# Altium footprint library Miscellaneous THD.PcbLib: 216 footprints (part 15 of 15)
Each footprint in its own frame and in the unit in brackets; x right, y up, seen from the top. Pads: shape width x height; smd on the part's side, far side on the other; paste and mask are expansions set on the pad; w line width, h text height; cw(c..) or ccw(c..) is an arc to the next point about the centre after c.
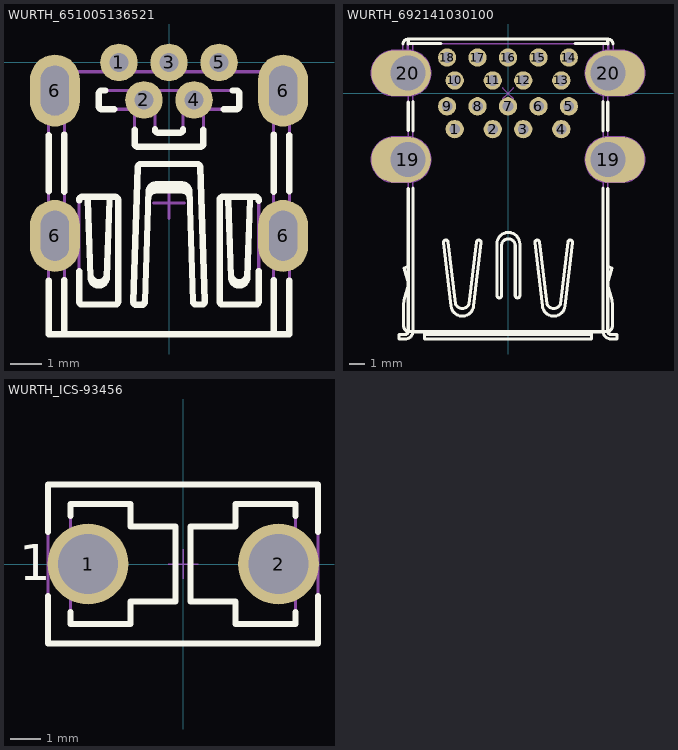
[diagram p14: the footprints below, top view; thin cyan lines are the x and y axes]

## WURTH_651005136521 [mm] "Mini USB Type B Horizontal 5 Contacts"
height 3.9
pads (9):
  round 1.2 hole 0.6: 1(-1.6,0) 2(-0.8,-1.2) 3(0,0) 4(0.8,-1.2) 5(1.6,0)
  oval 1.6x2.3 hole 0.9 slot 1.6 at 90 deg: 6(-3.65,-5.55) 6(-3.65,-0.9) 6(3.65,-5.55) 6(3.65,-0.9)
Top Overlay:
  lines w0.2: -3.85,-6.982 -3.85,-8.7 3.85,-8.7 3.85,-6.982 ; -3.85,-4.118 -3.85,-2.332 ; -3.35,-8.7 -3.35,-6.958 ; -3.35,-4.142 -3.35,-2.308 ; -2.875,-6.681 -2.875,-7.65 ccw(c-2.775,-7.65) -2.775,-7.75 -1.725,-7.75 ccw(c-1.725,-7.65) -1.625,-7.65 -1.625,-4.4 ccw(c-1.725,-4.4) -1.725,-4.3 -2.775,-4.3 ccw(c-2.775,-4.4) -2.875,-4.4 -2.875,-4.419 ; -2.694,-4.3 cw(c-2.694,-4.396) -2.597,-4.396 -2.509,-6.881 ccw(c-2.25,-6.881) -1.991,-6.881 -1.904,-4.396 ; -2.513,-6.771 ccw(c-2.25,-6.769) -1.987,-6.769 ; -2.036,-0.9 -2.15,-0.9 ccw(c-2.15,-1) -2.25,-1 -2.25,-1.4 ccw(c-2.15,-1.4) -2.15,-1.5 -1.754,-1.5 ; -1.904,-4.403 cw(c-1.801,-4.403) -1.801,-4.3 ; -1.1,-2.154 -1.1,-2.6 ccw(c-1,-2.6) -1,-2.7 1,-2.7 ccw(c1,-2.6) 1.1,-2.6 1.1,-2.154 ; -0.661,-4.328 cw(c-0.425,-4.336) -0.425,-4.1 0.425,-4.1 cw(c0.425,-4.336) 0.661,-4.328 ; -0.45,-2.137 -0.45,-2.15 ccw(c-0.35,-2.15) -0.35,-2.25 0.35,-2.25 ccw(c0.35,-2.15) 0.45,-2.15 0.45,-2.137 ; 1.754,-1.5 2.15,-1.5 ccw(c2.15,-1.4) 2.25,-1.4 2.25,-1 ccw(c2.15,-1) 2.15,-0.9 2.036,-0.9 ; 1.802,-4.3 cw(c1.802,-4.396) 1.898,-4.396 1.987,-6.881 ccw(c2.246,-6.881) 2.504,-6.881 2.592,-4.396 ; 1.983,-6.771 ccw(c2.246,-6.769) 2.508,-6.769 ; 2.591,-4.403 cw(c2.695,-4.403) 2.695,-4.3 ; 2.871,-6.676 2.871,-7.65 cw(c2.771,-7.65) 2.771,-7.75 1.721,-7.75 cw(c1.721,-7.65) 1.621,-7.65 1.621,-4.4 cw(c1.721,-4.4) 1.721,-4.3 2.771,-4.3 cw(c2.771,-4.4) 2.871,-4.4 2.871,-4.424 ; 3.35,-8.7 3.35,-6.958 ; 3.35,-4.142 3.35,-2.308 ; 3.85,-4.118 3.85,-2.332 ; -1.147,-7.653 ccw(c-1.047,-7.657) -1.047,-7.757 -0.872,-7.757 ccw(c-0.872,-7.657) -0.772,-7.66 -0.654,-4.129 cw(c-0.418,-4.137) -0.418,-3.901 0.418,-3.901 cw(c0.418,-4.137) 0.654,-4.129 0.772,-7.653 ccw(c0.872,-7.65) 0.872,-7.75 1.047,-7.75 ccw(c1.047,-7.65) 1.147,-7.647 0.999,-3.347 ccw(c0.9,-3.35) 0.9,-3.25 -0.9,-3.25 ccw(c-0.9,-3.35) -0.999,-3.347 -1.147,-7.653
Mechanical 8:
  lines w0.1: -3.9,-5.9 -3.65,-5.9 ; -3.9,-5.55 -3.65,-5.55 ; -3.9,-5.2 -3.65,-5.2 ; -3.9,-1.25 -3.65,-1.25 ; -3.9,-0.9 -3.65,-0.9 ; -3.9,-0.55 -3.65,-0.55 ; -3.65,-6.15 -3.65,-5.9 ; -3.65,-5.8 -3.65,-5.55 ; -3.65,-5.3 -3.65,-5.55 ; -3.65,-4.95 -3.65,-5.2 ; -3.65,-1.5 -3.65,-1.25 ; -3.65,-1.15 -3.65,-0.9 ; -3.65,-0.65 -3.65,-0.9 ; -3.65,-0.3 -3.65,-0.55 ; -3.4,-5.9 -3.65,-5.9 ; -3.4,-5.55 -3.65,-5.55 ; -3.4,-5.2 -3.65,-5.2 ; -3.4,-1.25 -3.65,-1.25 ; -3.4,-0.9 -3.65,-0.9 ; -3.4,-0.55 -3.65,-0.55 ; -2.1,0 -1.6,0 ; -1.6,-0.5 -1.6,0 ; -1.6,0.5 -1.6,0 ; -1.3,-1.2 -0.8,-1.2 ; -1.1,0 -1.6,0 ; -0.8,-1.7 -0.8,-1.2 ; -0.8,-0.7 -0.8,-1.2 ; -0.5,-4.5 0,-4.5 ; -0.5,0 0,0 ; -0.3,-1.2 -0.8,-1.2 ; 0,-5 0,-4.5 ; 0,-4 0,-4.5 ; 0,-0.5 0,0 ; 0,0.5 0,0 ; 0.3,-1.2 0.8,-1.2 ; 0.5,-4.5 0,-4.5 ; 0.5,0 0,0 ; 0.8,-1.7 0.8,-1.2 ; 0.8,-0.7 0.8,-1.2 ; 1.1,0 1.6,0 ; 1.3,-1.2 0.8,-1.2 ; 1.6,-0.5 1.6,0 ; 1.6,0.5 1.6,0 ; 2.1,0 1.6,0 ; 3.4,-5.9 3.65,-5.9 ; 3.4,-5.55 3.65,-5.55 ; 3.4,-5.2 3.65,-5.2 ; 3.4,-1.25 3.65,-1.25 ; 3.4,-0.9 3.65,-0.9 ; 3.4,-0.55 3.65,-0.55 ; 3.65,-6.15 3.65,-5.9 ; 3.65,-5.8 3.65,-5.55 ; 3.65,-5.3 3.65,-5.55 ; 3.65,-4.95 3.65,-5.2 ; 3.65,-1.5 3.65,-1.25 ; 3.65,-1.15 3.65,-0.9 ; 3.65,-0.65 3.65,-0.9 ; 3.65,-0.3 3.65,-0.55 ; 3.9,-5.9 3.65,-5.9 ; 3.9,-5.55 3.65,-5.55 ; 3.9,-5.2 3.65,-5.2 ; 3.9,-1.25 3.65,-1.25 ; 3.9,-0.9 3.65,-0.9 ; 3.9,-0.55 3.65,-0.55 ; -4.1,-5.9 ccw(c-3.65,-5.9) -3.2,-5.9 -3.2,-5.2 ccw(c-3.65,-5.2) -4.1,-5.2 -4.1,-5.9 ; -4.1,-1.25 ccw(c-3.65,-1.25) -3.2,-1.25 -3.2,-0.55 ccw(c-3.65,-0.55) -4.1,-0.55 -4.1,-1.25 ; 3.2,-5.9 ccw(c3.65,-5.9) 4.1,-5.9 4.1,-5.2 ccw(c3.65,-5.2) 3.2,-5.2 3.2,-5.9 ; 3.2,-1.25 ccw(c3.65,-1.25) 4.1,-1.25 4.1,-0.55 ccw(c3.65,-0.55) 3.2,-0.55 3.2,-1.25
Mechanical 14:
  lines w0.1: -3.85,-5.955 cw(c-3.675,-5.595) -4.075,-5.595 -4.075,-5.505 cw(c-3.675,-5.505) -3.85,-5.145 ; -3.85,-1.305 cw(c-3.675,-0.945) -4.075,-0.945 -4.075,-0.855 cw(c-3.675,-0.855) -3.85,-0.495 ; -3.35,-8.7 -3.35,-0.3 ; -2.694,-4.3 cw(c-2.694,-4.396) -2.597,-4.396 -2.509,-6.881 ccw(c-2.25,-6.881) -1.991,-6.881 -1.904,-4.396 ; -2.513,-6.771 ccw(c-2.25,-6.769) -1.987,-6.769 ; -1.904,-4.403 cw(c-1.801,-4.403) -1.801,-4.3 ; -1.8,-0.3 -1.8,0.125 -1.4,0.125 -1.4,-0.3 ; -0.661,-4.328 cw(c-0.425,-4.336) -0.425,-4.1 0.425,-4.1 cw(c0.425,-4.336) 0.661,-4.328 ; -0.55,-0.9 cw(c-0.55,-1) -0.45,-1 -0.45,-2.15 ccw(c-0.35,-2.15) -0.35,-2.25 0.35,-2.25 ccw(c0.35,-2.15) 0.45,-2.15 0.45,-1 cw(c0.55,-1) 0.55,-0.9 ; -0.2,-0.3 -0.2,0.125 0.2,0.125 0.2,-0.3 ; 1.4,-0.3 1.4,0.125 1.8,0.125 1.8,-0.3 ; 1.802,-4.3 cw(c1.802,-4.396) 1.898,-4.396 1.987,-6.881 ccw(c2.246,-6.881) 2.504,-6.881 2.592,-4.396 ; 1.983,-6.771 ccw(c2.246,-6.769) 2.508,-6.769 ; 2.591,-4.403 cw(c2.695,-4.403) 2.695,-4.3 ; 3.35,-8.7 3.35,-0.3 ; 3.85,-5.955 ccw(c3.675,-5.595) 4.075,-5.595 4.075,-5.505 ccw(c3.675,-5.505) 3.85,-5.145 ; 3.85,-1.305 ccw(c3.675,-0.945) 4.075,-0.945 4.075,-0.855 ccw(c3.675,-0.855) 3.85,-0.495 ; -3.85,-8.7 3.85,-8.7 3.85,-0.3 -3.85,-0.3 -3.85,-8.7 ; -2.875,-7.65 ccw(c-2.775,-7.65) -2.775,-7.75 -1.725,-7.75 ccw(c-1.725,-7.65) -1.625,-7.65 -1.625,-4.4 ccw(c-1.725,-4.4) -1.725,-4.3 -2.775,-4.3 ccw(c-2.775,-4.4) -2.875,-4.4 -2.875,-7.65 ; -2.25,-1.4 ccw(c-2.15,-1.4) -2.15,-1.5 -1.2,-1.5 cw(c-1.2,-1.6) -1.1,-1.6 -1.1,-2.6 ccw(c-1,-2.6) -1,-2.7 1,-2.7 ccw(c1,-2.6) 1.1,-2.6 1.1,-1.6 cw(c1.2,-1.6) 1.2,-1.5 2.15,-1.5 ccw(c2.15,-1.4) 2.25,-1.4 2.25,-1 ccw(c2.15,-1) 2.15,-0.9 -2.15,-0.9 ccw(c-2.15,-1) -2.25,-1 -2.25,-1.4 ; -1.147,-7.653 ccw(c-1.047,-7.657) -1.047,-7.757 -0.872,-7.757 ccw(c-0.872,-7.657) -0.772,-7.66 -0.654,-4.129 cw(c-0.418,-4.137) -0.418,-3.901 0.418,-3.901 cw(c0.418,-4.137) 0.654,-4.129 0.772,-7.653 ccw(c0.872,-7.65) 0.872,-7.75 1.047,-7.75 ccw(c1.047,-7.65) 1.147,-7.647 0.999,-3.347 ccw(c0.9,-3.35) 0.9,-3.25 -0.9,-3.25 ccw(c-0.9,-3.35) -0.999,-3.347 -1.147,-7.653 ; 1.621,-7.65 ccw(c1.721,-7.65) 1.721,-7.75 2.771,-7.75 ccw(c2.771,-7.65) 2.871,-7.65 2.871,-4.4 ccw(c2.771,-4.4) 2.771,-4.3 1.721,-4.3 ccw(c1.721,-4.4) 1.621,-4.4 1.621,-7.65
3D body "WURTH_651005136521.stp": height 3.9, standoff -2.6, extent -4.075,-8.7 4.075,0.125

## WURTH_692141030100 [mm] "USB 3.0 Type A Stacked Right Angle Receptacle"
height 16.11
pads (22):
  round 1.2 hole 0.7: 1(-3.5,-2.35) 2(-1,-2.35) 3(1,-2.35) 4(3.5,-2.35) 5(4,-0.85) 6(2,-0.85) 7(0,-0.85) 8(-2,-0.85) 9(-4,-0.85) 10(-3.5,0.85) 11(-1,0.85) 12(1,0.85) 13(3.5,0.85) 14(4,2.35) 15(2,2.35) 16(0,2.35) 17(-2,2.35) 18(-4,2.35)
  oval 3.9x3 hole 2.3 copper offset -0.45,0: 19(-6.57,-4.35) 20(-6.57,1.33)
  oval 3.9x3 hole 2.3 copper offset 0.45,0: 19(6.57,-4.35) 20(6.57,1.33)
Top Overlay:
  lines w0.2: -6.9,3.23 cw(c-6.55,3.22) -6.55,3.57 ; -6.553,-15.666 cw(c-6.45,-15.28) -6.85,-15.28 -6.85,-13.78 cw(c-6.05,-13.78) -6.823,-13.575 -6.55,-12.544 ; -6.55,-12.49 -6.839,-11.461 -6.55,-11.38 ; -6.55,-6.25 -6.55,-15.63 ; -6.55,-2.45 -6.55,-0.57 ; -6.55,3.23 -6.55,3.57 ; -6.55,3.27 -4.392,3.27 ; -6.253,-15.68 -5.475,-15.68 ; -6.25,-6.223 -6.25,-15.63 cw(c-6.75,-15.63) -6.75,-16.13 -7.15,-16.13 -7.15,-15.83 -6.75,-15.83 ccw(c-6.75,-15.63) -6.55,-15.63 ; -6.25,-2.477 -6.25,-0.543 ; -5.475,-15.83 5.475,-15.83 ; -5.475,-15.63 -5.475,-16.13 5.475,-16.13 5.475,-15.634 ; 4.392,3.27 6.55,3.27 ; 5.475,-15.68 6.253,-15.68 ; 6.25,-6.223 6.25,-15.63 ccw(c6.75,-15.63) 6.762,-16.13 7.15,-16.13 7.15,-15.83 6.75,-15.83 cw(c6.75,-15.63) 6.55,-15.63 ; 6.25,-2.477 6.25,-0.543 ; 6.55,-12.544 6.823,-13.575 cw(c6.05,-13.78) 6.85,-13.78 6.85,-15.28 cw(c6.45,-15.28) 6.553,-15.666 ; 6.55,-12.49 6.839,-11.461 6.55,-11.381 ; 6.55,-6.25 6.55,-15.63 ; 6.55,-2.45 6.55,-0.57 ; 6.55,3.23 6.55,3.57 ; 6.9,3.23 ccw(c6.55,3.22) 6.55,3.57 ; -6.55,-15.63 6.55,-15.63 ; -6.55,3.57 6.55,3.57 ; -4.231,-9.797 cw(c-4.083,-9.779) -3.935,-9.763 -3.449,-13.83 ccw(c-3,-13.636) -2.551,-13.83 -2.065,-9.763 cw(c-1.917,-9.779) -1.769,-9.797 -2.255,-13.967 cw(c-3,-13.88) -3.745,-13.967 -4.231,-9.797 ; -0.725,-13.28 ccw(c-0.575,-13.28) -0.425,-13.28 -0.425,-9.947 cw(c0.025,-10.008) 0.475,-9.947 0.475,-13.28 ccw(c0.625,-13.28) 0.775,-13.28 0.775,-9.88 ccw(c0.025,-9.88) -0.725,-9.88 -0.725,-13.28 ; 1.769,-9.797 cw(c1.917,-9.779) 2.065,-9.763 2.551,-13.83 ccw(c3,-13.636) 3.449,-13.83 3.935,-9.763 cw(c4.083,-9.779) 4.231,-9.797 3.745,-13.967 cw(c3,-13.88) 2.255,-13.967 1.769,-9.797
Mechanical 8:
  circle w0.1: c6.57,1.33 r1.15
  circle w0.1: c6.57,-4.35 r1.15
  circle w0.1: c-6.57,-4.35 r1.15
  circle w0.1: c-6.57,1.33 r1.15
  lines w0.1: -7.52,-4.35 -7.02,-4.35 ; -7.52,1.33 -7.02,1.33 ; -7.07,1.33 -6.57,1.33 ; -7.02,-4.85 -7.02,-4.35 ; -7.02,-3.85 -7.02,-4.35 ; -7.02,0.83 -7.02,1.33 ; -7.02,1.83 -7.02,1.33 ; -6.57,-4.85 -6.57,-4.35 ; -6.57,-3.85 -6.57,-4.35 ; -6.57,0.83 -6.57,1.33 ; -6.57,1.83 -6.57,1.33 ; -6.07,-4.35 -6.57,-4.35 ; -6.07,1.33 -6.57,1.33 ; -4.5,-0.85 -4,-0.85 ; -4.5,2.35 -4,2.35 ; -4,-1.35 -4,-0.85 ; -4,-0.35 -4,-0.85 ; -4,1.85 -4,2.35 ; -4,2.85 -4,2.35 ; -3.5,-2.85 -3.5,-2.35 ; -3.5,-1.85 -3.5,-2.35 ; -3.5,-0.85 -4,-0.85 ; -3.5,0.35 -3.5,0.85 ; -3.5,1.35 -3.5,0.85 ; -3.5,2.35 -4,2.35 ; -3,-2.35 -3.5,-2.35 ; -3,0.85 -3.5,0.85 ; -2.5,-0.85 -2,-0.85 ; -2.5,2.35 -2,2.35 ; -2,-1.35 -2,-0.85 ; -2,-0.35 -2,-0.85 ; -2,1.85 -2,2.35 ; -2,2.85 -2,2.35 ; -1.5,-2.35 -1,-2.35 ; -1.5,-0.85 -2,-0.85 ; -1.5,0.85 -1,0.85 ; -1.5,2.35 -2,2.35 ; -1,-2.85 -1,-2.35 ; -1,-1.85 -1,-2.35 ; -1,0.35 -1,0.85 ; -1,1.35 -1,0.85 ; -0.5,-2.35 -1,-2.35 ; -0.5,-0.85 0,-0.85 ; -0.5,0.85 -1,0.85 ; -0.5,2.35 0,2.35 ; -0.354,-0.354 0,0 ; -0.354,0.354 0,0 ; 0,-1.35 0,-0.85 ; 0,-0.35 0,-0.85 ; 0,1.85 0,2.35 ; 0,2.85 0,2.35 ; 0.354,-0.354 0,0 ; 0.354,0.354 0,0 ; 0.5,-2.35 1,-2.35 ; 0.5,-0.85 0,-0.85 ; 0.5,0.85 1,0.85 ; 0.5,2.35 0,2.35 ; 1,-2.85 1,-2.35 ; 1,-1.85 1,-2.35 ; 1,0.35 1,0.85 ; 1,1.35 1,0.85 ; 1.5,-2.35 1,-2.35 ; 1.5,-0.85 2,-0.85 ; 1.5,0.85 1,0.85 ; 1.5,2.35 2,2.35 ; 2,-1.35 2,-0.85 ; 2,-0.35 2,-0.85 ; 2,1.85 2,2.35 ; 2,2.85 2,2.35 ; 2.5,-0.85 2,-0.85 ; 2.5,2.35 2,2.35 ; 3,-2.35 3.5,-2.35 ; 3,0.85 3.5,0.85 ; 3.5,-2.85 3.5,-2.35 ; 3.5,-1.85 3.5,-2.35 ; 3.5,-0.85 4,-0.85 ; 3.5,0.35 3.5,0.85 ; 3.5,1.35 3.5,0.85 ; 3.5,2.35 4,2.35 ; 4,-1.35 4,-0.85 ; 4,-0.35 4,-0.85 ; 4,1.85 4,2.35 ; 4,2.85 4,2.35 ; 4.5,-0.85 4,-0.85 ; 4.5,2.35 4,2.35 ; 6.07,-4.35 6.57,-4.35 ; 6.07,1.33 6.57,1.33 ; 6.57,-4.85 6.57,-4.35 ; 6.57,-3.85 6.57,-4.35 ; 6.57,0.83 6.57,1.33 ; 6.57,1.83 6.57,1.33 ; 7.02,-4.85 7.02,-4.35 ; 7.02,-3.85 7.02,-4.35 ; 7.02,0.83 7.02,1.33 ; 7.02,1.83 7.02,1.33 ; 7.52,-4.35 7.02,-4.35 ; 7.52,1.33 7.02,1.33 ; -7.47,-5.85 cw(c-7.47,-4.35) -7.47,-2.85 -6.57,-2.85 cw(c-6.57,-4.35) -6.57,-5.85 -7.47,-5.85 ; -7.47,-0.17 cw(c-7.47,1.33) -7.47,2.83 -6.57,2.83 cw(c-6.57,1.33) -6.57,-0.17 -7.47,-0.17 ; 6.57,-5.85 cw(c6.57,-4.35) 6.57,-2.85 7.47,-2.85 cw(c7.47,-4.35) 7.47,-5.85 6.57,-5.85 ; 6.57,-0.17 cw(c6.57,1.33) 6.57,2.83 7.47,2.83 cw(c7.47,1.33) 7.47,-0.17 6.57,-0.17
Mechanical 14:
  lines w0.1: -6.9,0.41 -7.697,0.593 -7.793,0.616 -7.793,2.044 -7.697,2.067 -6.9,2.25 ; -6.553,-15.666 cw(c-6.45,-15.28) -6.85,-15.28 -6.85,-13.78 cw(c-6.05,-13.78) -6.823,-13.575 -6.55,-12.544 ; -6.55,-12.49 -6.839,-11.461 -6.55,-11.38 ; -6.55,-5.35 -6.638,-5.331 -7.697,-5.087 -7.793,-5.064 -7.793,-3.636 -7.697,-3.613 -6.638,-3.369 -6.55,-3.35 ; -6.253,-15.68 -5.475,-15.68 ; -6.25,3.27 -6.25,-15.63 cw(c-6.75,-15.63) -6.75,-16.13 -7.15,-16.13 -7.15,-15.83 -6.75,-15.83 ccw(c-6.75,-15.63) -6.55,-15.63 ; -5.475,-15.83 5.475,-15.83 ; -5.475,-15.63 -5.475,-16.13 5.475,-16.13 5.475,-15.634 ; 5.475,-15.68 6.253,-15.68 ; 6.25,3.27 6.25,-15.63 ccw(c6.75,-15.63) 6.762,-16.13 7.15,-16.13 7.15,-15.83 6.75,-15.83 cw(c6.75,-15.63) 6.55,-15.63 ; 6.55,-12.544 6.823,-13.575 cw(c6.05,-13.78) 6.85,-13.78 6.85,-15.28 cw(c6.45,-15.28) 6.553,-15.666 ; 6.55,-12.49 6.839,-11.461 6.55,-11.381 ; 6.9,0.409 7.697,0.593 7.793,0.616 7.793,2.044 7.697,2.067 6.9,2.251 ; -6.55,-15.63 -6.55,3.57 ; -6.55,-15.63 6.55,-15.63 ; -6.55,3.57 ccw(c-6.55,3.22) -6.9,3.22 -6.9,0.17 -6.6,0.17 -6.6,3.22 cw(c-6.55,3.22) -6.55,3.27 6.55,3.27 cw(c6.55,3.22) 6.6,3.22 6.6,0.17 6.9,0.17 6.9,3.22 ccw(c6.55,3.22) 6.55,3.57 ; -6.55,3.57 6.55,3.57 ; 6.55,-15.63 6.55,3.57 ; -4.231,-9.797 cw(c-4.083,-9.779) -3.935,-9.763 -3.449,-13.83 ccw(c-3,-13.636) -2.551,-13.83 -2.065,-9.763 cw(c-1.917,-9.779) -1.769,-9.797 -2.255,-13.967 cw(c-3,-13.88) -3.745,-13.967 -4.231,-9.797 ; -0.725,-13.28 ccw(c-0.575,-13.28) -0.425,-13.28 -0.425,-9.947 cw(c0.025,-10.008) 0.475,-9.947 0.475,-13.28 ccw(c0.625,-13.28) 0.775,-13.28 0.775,-9.88 ccw(c0.025,-9.88) -0.725,-9.88 -0.725,-13.28 ; 1.769,-9.797 cw(c1.917,-9.779) 2.065,-9.763 2.551,-13.83 ccw(c3,-13.636) 3.449,-13.83 3.935,-9.763 cw(c4.083,-9.779) 4.231,-9.797 3.745,-13.967 cw(c3,-13.88) 2.255,-13.967 1.769,-9.797
3D body "WURTH_692141030100.stp": height 16.11, standoff -3.51, extent -7.795,-16.13 7.795,3.57

## WURTH_ICS-93456 [mm] "Pitch 6.35mm, IGBT Gate Connector"
height 14
pads (2):
  round 2.7 hole 2: 1(-3.175,0) 2(3.175,0)
Top Overlay:
  lines w0.2: -4.5,-1.065 -4.5,-2.65 4.5,-2.65 4.5,-1.065 ; -4.5,1.065 -4.5,2.65 4.5,2.65 4.5,1.065 ; -3.75,-1.6 -3.75,-2 -1.75,-2 -1.75,-1.25 -0.25,-1.25 -0.25,1.25 -1.75,1.25 -1.75,2 -3.75,2 -3.75,1.6 ; 3.75,-1.6 3.75,-2 1.75,-2 1.75,-1.25 0.25,-1.25 0.25,1.25 1.75,1.25 1.75,2 3.75,2 3.75,1.6
  text "1" at -5.475,-0.55 h1.2
Mechanical 8:
  lines w0.05: -3.675,0 -3.175,0 ; -3.175,-0.5 -3.175,0 ; -3.175,0.5 -3.175,0 ; -2.675,0 -3.175,0 ; -0.5,0 0,0 ; 0,-0.5 0,0 ; 0,0.5 0,0 ; 0.5,0 0,0 ; 2.675,0 3.175,0 ; 3.175,-0.5 3.175,0 ; 3.175,0.5 3.175,0 ; 3.675,0 3.175,0
Mechanical 14:
  lines w0.1: -4.5,-2.65 4.5,-2.65 4.5,2.65 -4.5,2.65 -4.5,-2.65 ; -3.75,-2 -1.75,-2 -1.75,-1.25 -0.25,-1.25 -0.25,1.25 -1.75,1.25 -1.75,2 -3.75,2 -3.75,-2 ; 0.25,-1.25 0.25,1.25 1.75,1.25 1.75,2 3.75,2 3.75,-2 1.75,-2 1.75,-1.25 0.25,-1.25
  text "1" at -5.475,-0.55 h1.2
3D body "WURTH_ICS93456.stp": height 14, standoff -4, extent -4.5,-2.65 4.5,2.65